# Altium footprint library WR-TBL_Pluggable PCB Header.PcbLib: 719 footprints (part 5 of 45)
Each footprint in its own frame and in the unit in brackets; x right, y up, seen from the top. Pads: shape width x height; smd on the part's side, far side on the other; paste and mask are expansions set on the pad; w line width, h text height; cw(c..) or ccw(c..) is an arc to the next point about the centre after c.
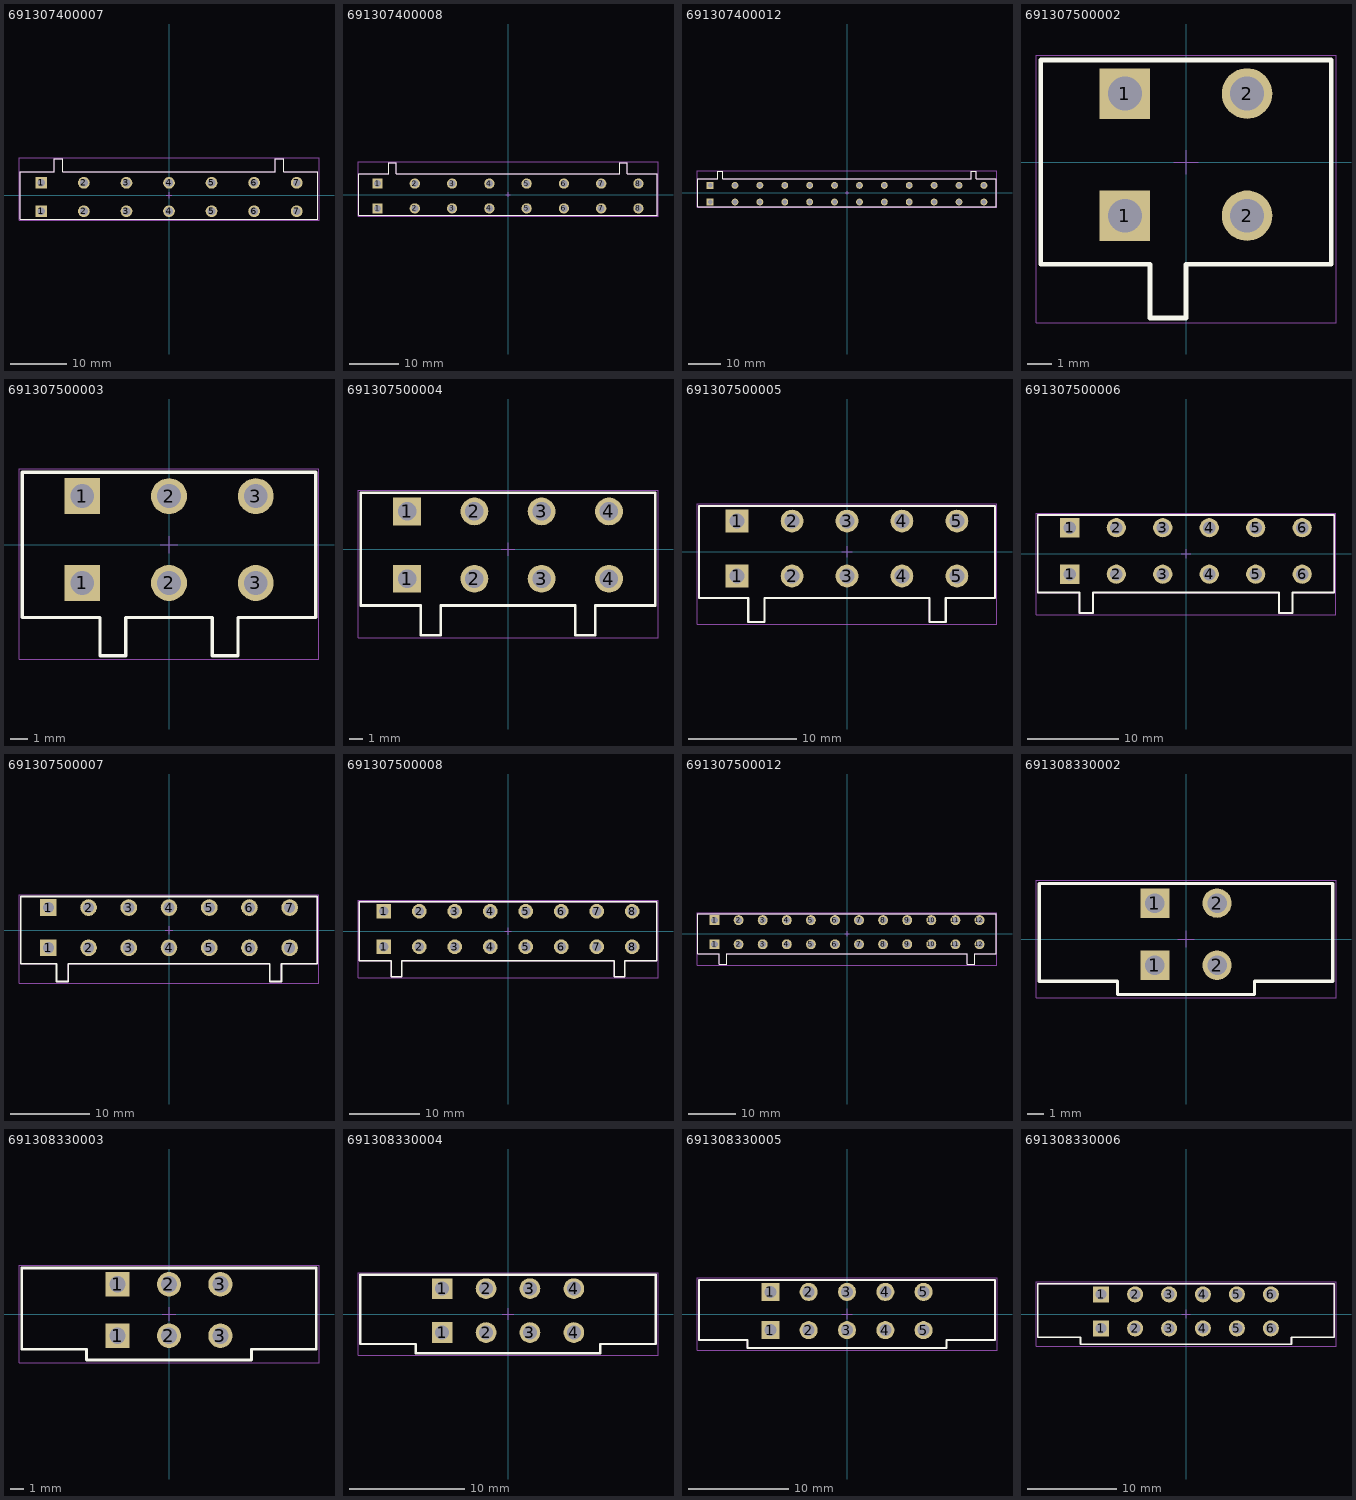
[diagram p4: the footprints below, top view; thin cyan lines are the x and y axes]

## 691307400007 [mm] "7.62 mm - Reversed Gender Vertical PCB Header - 07p"
height 19
pads (14):
  rect 2.1x2.1 hole 1.4: 1(-22.86,-2.85) 1(-22.86,2.23)
  round 2.1 hole 1.4: 2(-15.24,-2.85) 2(-15.24,2.23) 3(-7.62,-2.85) 3(-7.62,2.23) 4(0,-2.85) 4(0,2.23) 5(7.62,-2.85) 5(7.62,2.23) 6(15.24,-2.85) 6(15.24,2.23) 7(22.86,-2.85) 7(22.86,2.23)
Top Overlay:
  lines w0.2: 19.05,4.25 -19.05,4.25 -19.05,6.5 -20.56,6.5 -20.56,4.25 -26.66,4.25 -26.66,-4.25 26.66,-4.25 26.66,4.25 20.56,4.25 20.56,6.5 19.05,6.5 19.05,4.26
Mechanical 13:
  lines w0.1: 19.05,4.25 -19.05,4.25 -19.05,6.5 -20.56,6.5 -20.56,4.25 -26.66,4.25 -26.66,-4.25 26.66,-4.25 26.66,4.25 20.56,4.25 20.56,6.5 19.05,6.5 19.05,4.26
Mechanical 15:
  lines w0.05: -0.5,0 0.5,0 ; 0,-0.5 0,0.5 ; -26.86,-4.45 26.86,-4.45 26.86,6.7 -26.86,6.7 -26.86,-4.45
3D body "691307400007.stp": height 19.05, standoff -3.45, extent -26.66,-4.25 26.66,6.5

## 691307400008 [mm] "7.62 mm - Reversed Gender Vertical PCB Header - 08p"
height 19
pads (16):
  rect 2.1x2.1 hole 1.4: 1(-26.67,-2.85) 1(-26.67,2.23)
  round 2.1 hole 1.4: 2(-19.05,-2.85) 2(-19.05,2.23) 3(-11.43,-2.85) 3(-11.43,2.23) 4(-3.81,-2.85) 4(-3.81,2.23) 5(3.81,-2.85) 5(3.81,2.23) 6(11.43,-2.85) 6(11.43,2.23) 7(19.05,-2.85) 7(19.05,2.23) 8(26.67,-2.85) 8(26.67,2.23)
Top Overlay:
  lines w0.2: 22.86,4.25 -22.86,4.25 -22.86,6.5 -24.37,6.5 -24.37,4.25 -30.47,4.25 -30.47,-4.25 30.47,-4.25 30.47,4.25 24.37,4.25 24.37,6.5 22.86,6.5 22.86,4.26
Mechanical 13:
  lines w0.1: 22.86,4.25 -22.86,4.25 -22.86,6.5 -24.37,6.5 -24.37,4.25 -30.47,4.25 -30.47,-4.25 30.47,-4.25 30.47,4.25 24.37,4.25 24.37,6.5 22.86,6.5 22.86,4.26
Mechanical 15:
  lines w0.05: -0.5,0 0.5,0 ; 0,-0.5 0,0.5 ; -30.67,-4.45 -30.67,6.7 30.67,6.7 30.67,-4.45 -30.67,-4.45
3D body "691307400008.stp": height 19.05, standoff -3.45, extent -30.47,-4.25 30.47,6.5

## 691307400012 [mm] "7.62 mm - Reversed Gender Vertical PCB Header - 12p"
height 19
pads (24):
  rect 2.1x2.1 hole 1.4: 1(-41.91,-2.85) 1(-41.91,2.23)
  round 2.1 hole 1.4: 2(-34.29,-2.85) 2(-34.29,2.23) 3(-26.67,-2.85) 3(-26.67,2.23) 4(-19.05,-2.85) 4(-19.05,2.23) 5(-11.43,-2.85) 5(-11.43,2.23) 6(-3.81,-2.85) 6(-3.81,2.23) 7(3.81,-2.85) 7(3.81,2.23) 8(11.43,-2.85) 8(11.43,2.23) 9(19.05,-2.85) 9(19.05,2.23) 10(26.67,-2.85) 10(26.67,2.23) 11(34.29,-2.85) 11(34.29,2.23) 12(41.91,-2.85) 12(41.91,2.23)
Top Overlay:
  lines w0.2: 38.1,4.25 -38.1,4.25 -38.1,6.5 -39.61,6.5 -39.61,4.25 -45.71,4.25 -45.71,-4.25 45.71,-4.25 45.71,4.25 39.61,4.25 39.61,6.5 38.1,6.5 38.1,4.26
Mechanical 13:
  lines w0.1: 38.1,4.25 -38.1,4.25 -38.1,6.5 -39.61,6.5 -39.61,4.25 -45.71,4.25 -45.71,-4.25 45.71,-4.25 45.71,4.25 39.61,4.25 39.61,6.5 38.1,6.5 38.1,4.26
Mechanical 15:
  lines w0.05: -0.5,0 0.5,0 ; 0,-0.5 0,0.5 ; -45.91,-4.45 45.91,-4.45 45.91,6.7 -45.91,6.7 -45.91,-4.45
3D body "691307400012.stp": height 19.05, standoff -3.45, extent -45.71,-4.25 45.71,6.5

## 691307500002 [mm] "5.08 mm Reversed Gender Vertical PCB Header - 02p"
height 19
pads (4):
  rect 2.1x2.1 hole 1.4: 1(-2.54,-2.23) 1(-2.54,2.85)
  round 2.1 hole 1.4: 2(2.54,-2.23) 2(2.54,2.85)
Top Overlay:
  lines w0.2: -6.04,-4.25 -6.04,4.25 6.04,4.25 6.04,-4.25 0,-4.25 0,-6.49 -1.5,-6.49 -1.5,-4.25 -6.04,-4.25
Mechanical 13:
  lines w0.1: -6.04,-4.25 -1.5,-4.25 -1.5,-6.49 0,-6.49 0,-4.25 6.04,-4.25 6.04,4.25 -6.04,4.25 -6.04,-4.25
Mechanical 15:
  lines w0.05: -0.5,0 0.5,0 ; 0,-0.5 0,0.5 ; -6.24,-6.69 -6.24,4.45 6.24,4.45 6.24,-6.69 -6.24,-6.69
3D body "691307500002.stp": height 19.15, standoff -3.35, extent -6.04,-6.55 6.04,4.25

## 691307500003 [mm] "5.08 mm Reversed Gender Vertical PCB Header - 03p"
height 19
pads (6):
  rect 2.1x2.1 hole 1.4: 1(-5.08,-2.23) 1(-5.08,2.85)
  round 2.1 hole 1.4: 2(0,-2.23) 2(0,2.85) 3(5.08,-2.23) 3(5.08,2.85)
Top Overlay:
  lines w0.2: -8.58,-4.25 -8.58,4.25 8.58,4.25 8.58,-4.25 4.04,-4.25 4.04,-6.49 2.54,-6.49 2.54,-4.25 -2.54,-4.25 -2.54,-6.49 -4.04,-6.49 -4.04,-4.25 -8.58,-4.25
Mechanical 13:
  lines w0.1: -8.58,-4.25 -4.04,-4.25 -4.04,-6.49 -2.54,-6.49 -2.54,-4.25 2.54,-4.25 2.54,-6.49 4.04,-6.49 4.04,-4.25 8.58,-4.25 8.58,4.25 -8.58,4.25 -8.58,-4.25
Mechanical 15:
  lines w0.05: -0.5,0 0.5,0 ; 0,-0.5 0,0.5 ; -8.78,-6.69 -8.78,4.45 8.78,4.45 8.78,-6.69 -8.78,-6.69
3D body "691307500003.stp": height 19.15, standoff -3.35, extent -8.58,-6.55 8.58,4.25

## 691307500004 [mm] "5.08 mm Reversed Gender Vertical PCB Header - 04p"
height 19
pads (8):
  rect 2.1x2.1 hole 1.4: 1(-7.62,-2.23) 1(-7.62,2.85)
  round 2.1 hole 1.4: 2(-2.54,-2.23) 2(-2.54,2.85) 3(2.54,-2.23) 3(2.54,2.85) 4(7.62,-2.23) 4(7.62,2.85)
Top Overlay:
  lines w0.2: -11.12,-4.25 -6.58,-4.25 -6.58,-6.49 -5.08,-6.49 -5.08,-4.25 5.08,-4.25 5.08,-6.49 6.58,-6.49 6.58,-4.25 11.12,-4.25 11.12,4.25 -11.12,4.25 -11.12,-4.25
Mechanical 13:
  lines w0.1: -11.12,-4.25 -11.12,4.25 11.12,4.25 11.12,-4.25 6.58,-4.25 6.58,-6.49 5.08,-6.49 5.08,-4.25 -5.08,-4.25 -5.08,-6.49 -6.58,-6.49 -6.58,-4.25 -11.12,-4.25
Mechanical 15:
  lines w0.05: -0.5,0 0.5,0 ; 0,-0.5 0,0.5 ; -11.32,-6.69 11.32,-6.69 11.32,4.45 -11.32,4.45 -11.32,-6.69
3D body "691307500004.stp": height 19.15, standoff -3.35, extent -11.12,-6.55 11.12,4.25

## 691307500005 [mm] "5.08 mm Reversed Gender Vertical PCB Header - 05p"
height 19
pads (10):
  rect 2.1x2.1 hole 1.4: 1(-10.16,-2.23) 1(-10.16,2.85)
  round 2.1 hole 1.4: 2(-5.08,-2.23) 2(-5.08,2.85) 3(0,-2.23) 3(0,2.85) 4(5.08,-2.23) 4(5.08,2.85) 5(10.16,-2.23) 5(10.16,2.85)
Top Overlay:
  lines w0.2: -13.66,-4.25 -9.12,-4.25 -9.12,-6.49 -7.62,-6.49 -7.62,-4.25 7.62,-4.25 7.62,-6.49 9.12,-6.49 9.12,-4.25 13.66,-4.25 13.66,4.25 -13.66,4.25 -13.66,-4.25
Mechanical 13:
  lines w0.1: -13.66,-4.25 -13.66,4.25 13.66,4.25 13.66,-4.25 9.12,-4.25 9.12,-6.49 7.62,-6.49 7.62,-4.25 -7.62,-4.25 -7.62,-6.49 -9.12,-6.49 -9.12,-4.25 -13.66,-4.25
Mechanical 15:
  lines w0.05: -0.5,0 0.5,0 ; 0,-0.5 0,0.5 ; -13.86,-6.69 13.86,-6.69 13.86,4.45 -13.86,4.45 -13.86,-6.69
3D body "691307500005.stp": height 19.15, standoff -3.35, extent -13.66,-6.542 13.66,4.25

## 691307500006 [mm] "5.08 mm Reversed Gender Vertical PCB Header - 06p"
height 19
pads (12):
  rect 2.1x2.1 hole 1.4: 1(-12.7,-2.23) 1(-12.7,2.85)
  round 2.1 hole 1.4: 2(-7.62,-2.23) 2(-7.62,2.85) 3(-2.54,-2.23) 3(-2.54,2.85) 4(2.54,-2.23) 4(2.54,2.85) 5(7.62,-2.23) 5(7.62,2.85) 6(12.7,-2.23) 6(12.7,2.85)
Top Overlay:
  lines w0.2: -16.2,-4.25 -16.2,4.25 16.2,4.25 16.2,-4.25 11.66,-4.25 11.66,-6.49 10.16,-6.49 10.16,-4.25 -10.16,-4.25 -10.16,-6.49 -11.66,-6.49 -11.66,-4.25 -16.2,-4.25
Mechanical 13:
  lines w0.1: -16.2,-4.25 -11.66,-4.25 -11.66,-6.49 -10.16,-6.49 -10.16,-4.25 10.16,-4.25 10.16,-6.49 11.66,-6.49 11.66,-4.25 16.2,-4.25 16.2,4.25 -16.2,4.25 -16.2,-4.25
Mechanical 15:
  lines w0.05: -0.5,0 0.5,0 ; 0,-0.5 0,0.5 ; -16.4,-6.69 -16.4,4.45 16.4,4.45 16.4,-6.69 -16.4,-6.69
3D body "691307500006.stp": height 19.15, standoff -3.35, extent -16.2,-6.542 16.2,4.25

## 691307500007 [mm] "5.08 mm Reversed Gender Vertical PCB Header - 07p"
height 19
pads (14):
  rect 2.1x2.1 hole 1.4: 1(-15.24,-2.23) 1(-15.24,2.85)
  round 2.1 hole 1.4: 2(-10.16,-2.23) 2(-10.16,2.85) 3(-5.08,-2.23) 3(-5.08,2.85) 4(0,-2.23) 4(0,2.85) 5(5.08,-2.23) 5(5.08,2.85) 6(10.16,-2.23) 6(10.16,2.85) 7(15.24,-2.23) 7(15.24,2.85)
Top Overlay:
  lines w0.2: -18.74,-4.25 -18.74,4.25 18.74,4.25 18.74,-4.25 14.2,-4.25 14.2,-6.49 12.7,-6.49 12.7,-4.25 -12.7,-4.25 -12.7,-6.49 -14.2,-6.49 -14.2,-4.25 -18.74,-4.25
Mechanical 13:
  lines w0.1: -18.74,-4.25 -14.2,-4.25 -14.2,-6.49 -12.7,-6.49 -12.7,-4.25 12.7,-4.25 12.7,-6.49 14.2,-6.49 14.2,-4.25 18.74,-4.25 18.74,4.25 -18.74,4.25 -18.74,-4.25
Mechanical 15:
  lines w0.05: -0.5,0 0.5,0 ; 0,-0.5 0,0.5 ; -18.94,-6.69 -18.94,4.45 18.94,4.45 18.94,-6.69 -18.94,-6.69
3D body "691307500007.stp": height 19.15, standoff -3.35, extent -18.74,-6.542 18.74,4.25

## 691307500008 [mm] "5.08 mm Reversed Gender Vertical PCB Header - 08p"
height 19
pads (16):
  rect 2.1x2.1 hole 1.4: 1(-17.78,-2.23) 1(-17.78,2.85)
  round 2.1 hole 1.4: 2(-12.7,-2.23) 2(-12.7,2.85) 3(-7.62,-2.23) 3(-7.62,2.85) 4(-2.54,-2.23) 4(-2.54,2.85) 5(2.54,-2.23) 5(2.54,2.85) 6(7.62,-2.23) 6(7.62,2.85) 7(12.7,-2.23) 7(12.7,2.85) 8(17.78,-2.23) 8(17.78,2.85)
Top Overlay:
  lines w0.2: -21.28,-4.25 -21.28,4.25 21.28,4.25 21.28,-4.25 16.74,-4.25 16.74,-6.49 15.24,-6.49 15.24,-4.25 -15.24,-4.25 -15.24,-6.49 -16.74,-6.49 -16.74,-4.25 -21.28,-4.25
Mechanical 13:
  lines w0.1: -21.28,-4.25 -16.74,-4.25 -16.74,-6.49 -15.24,-6.49 -15.24,-4.25 15.24,-4.25 15.24,-6.49 16.74,-6.49 16.74,-4.25 21.28,-4.25 21.28,4.25 -21.28,4.25 -21.28,-4.25
Mechanical 15:
  lines w0.05: -0.5,0 0.5,0 ; 0,-0.5 0,0.5 ; -21.48,-6.69 -21.48,4.45 21.48,4.45 21.48,-6.69 -21.48,-6.69
3D body "691307500008.stp": height 19.15, standoff -3.35, extent -21.28,-6.542 21.28,4.25

## 691307500012 [mm] "5.08 mm Reversed Gender Vertical PCB Header - 12p"
height 19
pads (24):
  rect 2.1x2.1 hole 1.4: 1(-27.94,-2.23) 1(-27.94,2.85)
  round 2.1 hole 1.4: 2(-22.86,-2.23) 2(-22.86,2.85) 3(-17.78,-2.23) 3(-17.78,2.85) 4(-12.7,-2.23) 4(-12.7,2.85) 5(-7.62,-2.23) 5(-7.62,2.85) 6(-2.54,-2.23) 6(-2.54,2.85) 7(2.54,-2.23) 7(2.54,2.85) 8(7.62,-2.23) 8(7.62,2.85) 9(12.7,-2.23) 9(12.7,2.85) 10(17.78,-2.23) 10(17.78,2.85) 11(22.86,-2.23) 11(22.86,2.85) 12(27.94,-2.23) 12(27.94,2.85)
Top Overlay:
  lines w0.2: -31.44,-4.25 -26.9,-4.25 -26.9,-6.49 -25.4,-6.49 -25.4,-4.25 25.4,-4.25 25.4,-6.49 26.9,-6.49 26.9,-4.25 31.44,-4.25 31.44,4.25 -31.44,4.25 -31.44,-4.25
Mechanical 13:
  lines w0.1: -31.44,-4.25 -31.44,4.25 31.44,4.25 31.44,-4.25 26.9,-4.25 26.9,-6.49 25.4,-6.49 25.4,-4.25 -25.4,-4.25 -25.4,-6.49 -26.9,-6.49 -26.9,-4.25 -31.44,-4.25
Mechanical 15:
  lines w0.05: -0.5,0 0.5,0 ; 0,-0.5 0,0.5 ; -31.64,-6.69 31.64,-6.69 31.64,4.45 -31.64,4.45 -31.64,-6.69
3D body "691307500012.stp": height 19.15, standoff -3.35, extent -31.44,-6.542 31.44,4.25

## 691308330002 [mm] "Vertical Reserved PCB Header with Flanges, pitch 3.81mm, 02p"
height 14.5
pads (4):
  rect 1.8x1.8 hole 1.2: 1(-1.905,-1.61) 1(-1.905,2.2)
  round 1.8 hole 1.2: 2(1.905,-1.61) 2(1.905,2.2)
Top Overlay:
  lines w0.2: -9.005,-2.6 -9.005,3.4 9.005,3.4 9.005,-2.6 4.2,-2.6 4.2,-3.4 -4.2,-3.4 -4.2,-2.6 -9.005,-2.6
Mechanical 13:
  lines w0.1: -9.005,-2.6 -4.2,-2.6 -4.2,-3.4 4.2,-3.4 4.2,-2.6 9.005,-2.6 9.005,3.4 -9.005,3.4 -9.005,-2.6
Mechanical 15:
  lines w0.05: -0.5,0 0.5,0 ; 0,-0.5 0,0.5 ; -9.205,-3.6 -9.205,3.6 9.205,3.6 9.205,-3.6 -9.205,-3.6
3D body "691308330002.stp": height 14.6, standoff -3.3, extent -9.005,-3.4 9.005,3.4

## 691308330003 [mm] "Vertical Reserved PCB Header with Flanges, pitch 3.81mm, 03p"
height 14.5
pads (6):
  rect 1.8x1.8 hole 1.2: 1(-3.81,-1.61) 1(-3.81,2.2)
  round 1.8 hole 1.2: 2(0,-1.61) 2(0,2.2) 3(3.81,-1.61) 3(3.81,2.2)
Top Overlay:
  lines w0.2: -10.91,-2.6 -6.105,-2.6 -6.105,-3.4 6.105,-3.4 6.105,-2.6 10.91,-2.6 10.91,3.4 -10.91,3.4 -10.91,-2.6
Mechanical 13:
  lines w0.1: -10.91,-2.6 -10.91,3.4 10.91,3.4 10.91,-2.6 6.105,-2.6 6.105,-3.4 -6.105,-3.4 -6.105,-2.6 -10.91,-2.6
Mechanical 15:
  lines w0.05: -0.5,0 0.5,0 ; 0,-0.5 0,0.5 ; -11.11,-3.6 11.11,-3.6 11.11,3.6 -11.11,3.6 -11.11,-3.6
3D body "691308330003.stp": height 14.6, standoff -3.3, extent -10.91,-3.4 10.91,3.4

## 691308330004 [mm] "Vertical Reserved PCB Header with Flanges, pitch 3.81mm, 04p"
height 14.5
pads (8):
  rect 1.8x1.8 hole 1.2: 1(-5.715,-1.61) 1(-5.715,2.2)
  round 1.8 hole 1.2: 2(-1.905,-1.61) 2(-1.905,2.2) 3(1.905,-1.61) 3(1.905,2.2) 4(5.715,-1.61) 4(5.715,2.2)
Top Overlay:
  lines w0.2: -12.815,-2.6 -8.01,-2.6 -8.01,-3.4 8.01,-3.4 8.01,-2.6 12.815,-2.6 12.815,3.4 -12.815,3.4 -12.815,-2.6
Mechanical 13:
  lines w0.1: -12.815,-2.6 -12.815,3.4 12.815,3.4 12.815,-2.6 8.01,-2.6 8.01,-3.4 -8.01,-3.4 -8.01,-2.6 -12.815,-2.6
Mechanical 15:
  lines w0.05: -0.5,0 0.5,0 ; 0,-0.5 0,0.5 ; -13.015,-3.6 13.015,-3.6 13.015,3.6 -13.015,3.6 -13.015,-3.6
3D body "691308330004.stp": height 14.6, standoff -3.3, extent -12.815,-3.4 12.815,3.4

## 691308330005 [mm] "Vertical Reserved PCB Header with Flanges, pitch 3.81mm, 05p"
height 14.5
pads (10):
  rect 1.8x1.8 hole 1.2: 1(-7.62,-1.61) 1(-7.62,2.2)
  round 1.8 hole 1.2: 2(-3.81,-1.61) 2(-3.81,2.2) 3(0,-1.61) 3(0,2.2) 4(3.81,-1.61) 4(3.81,2.2) 5(7.62,-1.61) 5(7.62,2.2)
Top Overlay:
  lines w0.2: -14.72,-2.6 -14.72,3.4 14.72,3.4 14.72,-2.6 9.915,-2.6 9.915,-3.4 -9.915,-3.4 -9.915,-2.6 -14.72,-2.6
Mechanical 13:
  lines w0.1: -14.72,-2.6 -9.915,-2.6 -9.915,-3.4 9.915,-3.4 9.915,-2.6 14.72,-2.6 14.72,3.4 -14.72,3.4 -14.72,-2.6
Mechanical 15:
  lines w0.05: -0.5,0 0.5,0 ; 0,-0.5 0,0.5 ; -14.92,-3.6 -14.92,3.6 14.92,3.6 14.92,-3.6 -14.92,-3.6
3D body "691308330005.stp": height 14.6, standoff -3.3, extent -14.72,-3.4 14.72,3.4

## 691308330006 [mm] "Vertical Reserved PCB Header with Flanges, pitch 3.81mm, 06p"
height 14.5
pads (12):
  rect 1.8x1.8 hole 1.2: 1(-9.525,-1.61) 1(-9.525,2.2)
  round 1.8 hole 1.2: 2(-5.715,-1.61) 2(-5.715,2.2) 3(-1.905,-1.61) 3(-1.905,2.2) 4(1.905,-1.61) 4(1.905,2.2) 5(5.715,-1.61) 5(5.715,2.2) 6(9.525,-1.61) 6(9.525,2.2)
Top Overlay:
  lines w0.2: -16.625,-2.6 -16.625,3.4 16.625,3.4 16.625,-2.6 11.82,-2.6 11.82,-3.4 -11.82,-3.4 -11.82,-2.6 -16.625,-2.6
Mechanical 13:
  lines w0.1: -16.625,-2.6 -11.82,-2.6 -11.82,-3.4 11.82,-3.4 11.82,-2.6 16.625,-2.6 16.625,3.4 -16.625,3.4 -16.625,-2.6
Mechanical 15:
  lines w0.05: -0.5,0 0.5,0 ; 0,-0.5 0,0.5 ; -16.825,-3.6 -16.825,3.6 16.825,3.6 16.825,-3.6 -16.825,-3.6
3D body "691308330006.stp": height 14.6, standoff -3.3, extent -16.625,-3.4 16.625,3.4